# Altium footprint library ref-packages.PCBLIB: 1543 footprints (part 35 of 103) (continued)
## MQFP64-1 [mm]
pads (64):
  rect 2.2x0.35 smd: 1(-8.1,6) 2(-8.1,5.2) 3(-8.1,4.4) 4(-8.1,3.6) 5(-8.1,2.8) 6(-8.1,2) 7(-8.1,1.2) 8(-8.1,0.4) 9(-8.1,-0.4) 10(-8.1,-1.2) 11(-8.1,-2) 12(-8.1,-2.8) 13(-8.1,-3.6) 14(-8.1,-4.4) 15(-8.1,-5.2) 16(-8.1,-6) 33(8.1,-6) 34(8.1,-5.2) 35(8.1,-4.4) 36(8.1,-3.6) 37(8.1,-2.8) 38(8.1,-2) 39(8.1,-1.2) 40(8.1,-0.4) 41(8.1,0.4) 42(8.1,1.2) 43(8.1,2) 44(8.1,2.8) 45(8.1,3.6) 46(8.1,4.4) 47(8.1,5.2) 48(8.1,6)
  rect 0.35x2.2 smd: 17(-6,-8.1) 18(-5.2,-8.1) 19(-4.4,-8.1) 20(-3.6,-8.1) 21(-2.8,-8.1) 22(-2,-8.1) 23(-1.2,-8.1) 24(-0.4,-8.1) 25(0.4,-8.1) 26(1.2,-8.1) 27(2,-8.1) 28(2.8,-8.1) 29(3.6,-8.1) 30(4.4,-8.1) 31(5.2,-8.1) 32(6,-8.1) 49(6,8.1) 50(5.2,8.1) 51(4.4,8.1) 52(3.6,8.1) 53(2.8,8.1) 54(2,8.1) 55(1.2,8.1) 56(0.4,8.1) 57(-0.4,8.1) 58(-1.2,8.1) 59(-2,8.1) 60(-2.8,8.1) 61(-3.6,8.1) 62(-4.4,8.1) 63(-5.2,8.1) 64(-6,8.1)
Top Overlay:
  circle w0.152: c-5.75,5.75 r0.5
  lines w0.152: -6.873,-6.373 -6.873,6.373 -6.373,6.873 6.373,6.873 6.873,6.373 6.873,-6.373 6.373,-6.873 -6.373,-6.873 -6.873,-6.373
Mechanical 16:
  rectangle: 6.873,5.825 8.473,6.175
  rectangle: 6.873,5.025 8.473,5.375
  rectangle: 6.873,4.225 8.473,4.575
  rectangle: 6.873,3.425 8.473,3.775
  rectangle: 6.873,2.625 8.473,2.975
  rectangle: 6.873,1.825 8.473,2.175
  rectangle: 6.873,1.025 8.473,1.375
  rectangle: 6.873,0.225 8.473,0.575
  rectangle: 6.873,-0.575 8.473,-0.225
  rectangle: 6.873,-1.375 8.473,-1.025
  rectangle: 6.873,-2.175 8.473,-1.825
  rectangle: 6.873,-2.975 8.473,-2.625
  rectangle: 6.873,-3.775 8.473,-3.425
  rectangle: 6.873,-4.575 8.473,-4.225
  rectangle: 6.873,-5.375 8.473,-5.025
  rectangle: 6.873,-6.175 8.473,-5.825
  rectangle: 5.825,-8.473 6.175,-6.873
  rectangle: 5.025,-8.473 5.375,-6.873
  rectangle: 4.225,-8.473 4.575,-6.873
  rectangle: 3.425,-8.473 3.775,-6.873
  rectangle: 2.625,-8.473 2.975,-6.873
  rectangle: 1.825,-8.473 2.175,-6.873
  rectangle: 1.025,-8.473 1.375,-6.873
  rectangle: 0.225,-8.473 0.575,-6.873
  rectangle: -0.575,-8.473 -0.225,-6.873
  rectangle: -1.375,-8.473 -1.025,-6.873
  rectangle: -2.175,-8.473 -1.825,-6.873
  rectangle: -2.975,-8.473 -2.625,-6.873
  rectangle: -3.775,-8.473 -3.425,-6.873
  rectangle: -4.575,-8.473 -4.225,-6.873
  rectangle: -5.375,-8.473 -5.025,-6.873
  rectangle: -6.175,-8.473 -5.825,-6.873
  rectangle: -8.473,-6.175 -6.873,-5.825
  rectangle: -8.473,-5.375 -6.873,-5.025
  rectangle: -8.473,-4.575 -6.873,-4.225
  rectangle: -8.473,-3.775 -6.873,-3.425
  rectangle: -8.473,-2.975 -6.873,-2.625
  rectangle: -8.473,-2.175 -6.873,-1.825
  rectangle: -8.473,-1.375 -6.873,-1.025
  rectangle: -8.473,-0.575 -6.873,-0.225
  rectangle: -8.473,0.225 -6.873,0.575
  rectangle: -8.473,1.025 -6.873,1.375
  rectangle: -8.473,1.825 -6.873,2.175
  rectangle: -8.473,2.625 -6.873,2.975
  rectangle: -8.473,3.425 -6.873,3.775
  rectangle: -8.473,4.225 -6.873,4.575
  rectangle: -8.473,5.025 -6.873,5.375
  rectangle: -8.473,5.825 -6.873,6.175
  rectangle: -5.375,6.873 -5.025,8.473
  rectangle: -6.175,6.873 -5.825,8.473
  rectangle: -3.775,6.873 -3.425,8.473
  rectangle: -4.575,6.873 -4.225,8.473
  rectangle: -2.975,6.873 -2.625,8.473
  rectangle: -2.175,6.848 -1.825,8.473
  rectangle: -1.375,6.873 -1.025,8.473
  rectangle: -0.575,6.873 -0.225,8.473
  rectangle: 0.225,6.873 0.575,8.473
  rectangle: 1.025,6.873 1.375,8.473
  rectangle: 1.825,6.873 2.175,8.473
  rectangle: 2.625,6.873 2.975,8.473
  rectangle: 3.425,6.873 3.775,8.473
  rectangle: 4.225,6.873 4.575,8.473
  rectangle: 5.825,6.873 6.175,8.473
  rectangle: 5.025,6.873 5.375,8.473

## MQFP80-1 [mm]
pads (80):
  rect 2.2x0.35 smd: 1(-8.125,6.175) 2(-8.125,5.525) 3(-8.125,4.875) 4(-8.125,4.225) 5(-8.125,3.575) 6(-8.125,2.925) 7(-8.125,2.275) 8(-8.125,1.625) 9(-8.125,0.975) 10(-8.125,0.325) 11(-8.125,-0.325) 12(-8.125,-0.975) 13(-8.125,-1.625) 14(-8.125,-2.275) 15(-8.125,-2.925) 16(-8.125,-3.575) 17(-8.125,-4.225) 18(-8.125,-4.875) 19(-8.125,-5.525) 20(-8.125,-6.175) 41(8.1,-6.175) 42(8.1,-5.525) 43(8.1,-4.875) 44(8.1,-4.225) 45(8.1,-3.575) 46(8.1,-2.925) 47(8.1,-2.275) 48(8.1,-1.625) 49(8.1,-0.975) 50(8.1,-0.325) 51(8.1,0.325) 52(8.1,0.975) 53(8.1,1.625) 54(8.1,2.275) 55(8.1,2.925) 56(8.1,3.575) 57(8.1,4.225) 58(8.1,4.875) 59(8.1,5.525) 60(8.1,6.175)
  rect 0.35x2.2 smd: 21(-6.175,-8.1) 22(-5.525,-8.1) 23(-4.875,-8.1) 24(-4.225,-8.1) 25(-3.575,-8.1) 26(-2.925,-8.1) 27(-2.275,-8.1) 28(-1.625,-8.1) 29(-0.975,-8.1) 30(-0.325,-8.1) 31(0.325,-8.1) 32(0.975,-8.1) 33(1.625,-8.1) 34(2.275,-8.1) 35(2.925,-8.1) 36(3.575,-8.1) 37(4.225,-8.1) 38(4.875,-8.1) 39(5.525,-8.1) 40(6.175,-8.1) 61(6.175,8.1) 62(5.525,8.1) 63(4.875,8.1) 64(4.225,8.1) 65(3.575,8.1) 66(2.925,8.1) 67(2.275,8.1) 68(1.625,8.1) 69(0.975,8.1) 70(0.325,8.1) 71(-0.325,8.1) 72(-0.975,8.1) 73(-1.625,8.1) 74(-2.275,8.1) 75(-2.925,8.1) 76(-3.575,8.1) 77(-4.225,8.1) 78(-4.875,8.1) 79(-5.525,8.1) 80(-6.175,8.1)
Top Overlay:
  circle w0.152: c-5,5 r1.118
  lines w0.152: -6.873,-6.373 -6.873,6.373 -6.373,6.873 6.373,6.873 6.873,6.373 6.873,-6.373 6.373,-6.873 -6.373,-6.873 -6.873,-6.373
Mechanical 16:
  rectangle: 6,6.873 6.35,8.473
  rectangle: 5.35,6.873 5.7,8.473
  rectangle: 4.7,6.873 5.05,8.473
  rectangle: 4.05,6.873 4.4,8.473
  rectangle: 3.4,6.873 3.75,8.473
  rectangle: 2.75,6.873 3.1,8.473
  rectangle: 2.1,6.873 2.45,8.473
  rectangle: 1.45,6.873 1.8,8.473
  rectangle: 0.8,6.873 1.15,8.473
  rectangle: 0.15,6.873 0.5,8.473
  rectangle: -0.5,6.873 -0.15,8.473
  rectangle: -1.15,6.873 -0.8,8.473
  rectangle: -1.8,6.873 -1.45,8.473
  rectangle: -2.45,6.873 -2.1,8.473
  rectangle: -3.1,6.873 -2.75,8.473
  rectangle: -3.75,6.873 -3.4,8.473
  rectangle: -4.4,6.873 -4.05,8.473
  rectangle: -5.05,6.873 -4.7,8.473
  rectangle: -5.7,6.873 -5.35,8.473
  rectangle: -6.35,6.873 -6,8.473
  rectangle: -8.473,6 -6.898,6.35
  rectangle: -8.473,5.35 -6.898,5.7
  rectangle: -8.473,4.05 -6.898,4.4
  rectangle: -8.473,4.7 -6.898,5.05
  rectangle: -8.473,3.4 -6.898,3.75
  rectangle: -8.473,2.75 -6.898,3.1
  rectangle: -8.473,2.1 -6.898,2.45
  rectangle: -8.473,1.45 -6.898,1.8
  rectangle: -8.473,0.8 -6.898,1.15
  rectangle: -8.473,0.15 -6.898,0.5
  rectangle: -8.473,-0.5 -6.898,-0.15
  rectangle: -8.473,-1.15 -6.898,-0.8
  rectangle: -8.473,-1.8 -6.898,-1.45
  rectangle: -8.473,-2.45 -6.898,-2.1
  rectangle: -8.473,-3.1 -6.898,-2.75
  rectangle: -8.473,-3.75 -6.898,-3.4
  rectangle: -8.473,-4.4 -6.898,-4.05
  rectangle: -8.473,-5.05 -6.898,-4.7
  rectangle: -8.473,-5.7 -6.898,-5.35
  rectangle: -8.473,-6.35 -6.898,-6
  rectangle: -6.35,-8.473 -6,-6.898
  rectangle: -5.7,-8.473 -5.35,-6.873
  rectangle: -5.05,-8.473 -4.7,-6.873
  rectangle: -4.4,-8.473 -4.05,-6.873
  rectangle: -3.75,-8.473 -3.4,-6.873
  rectangle: -3.1,-8.473 -2.75,-6.873
  rectangle: -2.45,-8.473 -2.1,-6.873
  rectangle: -1.8,-8.473 -1.45,-6.873
  rectangle: -1.15,-8.473 -0.8,-6.873
  rectangle: -0.5,-8.473 -0.15,-6.873
  rectangle: 0.15,-8.473 0.5,-6.873
  rectangle: 0.8,-8.473 1.15,-6.873
  rectangle: 1.45,-8.473 1.8,-6.873
  rectangle: 2.1,-8.473 2.45,-6.873
  rectangle: 2.75,-8.473 3.1,-6.873
  rectangle: 3.4,-8.473 3.75,-6.873
  rectangle: 4.05,-8.473 4.4,-6.873
  rectangle: 4.7,-8.473 5.05,-6.873
  rectangle: 5.35,-8.473 5.7,-6.873
  rectangle: 6,-8.473 6.35,-6.873
  rectangle: 6.873,6 8.473,6.35
  rectangle: 6.873,5.35 8.473,5.7
  rectangle: 6.873,4.7 8.473,5.05
  rectangle: 6.873,4.05 8.473,4.4
  rectangle: 6.873,3.4 8.473,3.75
  rectangle: 6.873,2.75 8.473,3.1
  rectangle: 6.873,2.1 8.473,2.45
  rectangle: 6.873,1.45 8.473,1.8
  rectangle: 6.873,0.8 8.473,1.15
  rectangle: 6.873,0.15 8.473,0.5
  rectangle: 6.873,-0.5 8.473,-0.15
  rectangle: 6.873,-1.15 8.473,-0.8
  rectangle: 6.873,-1.8 8.473,-1.45
  rectangle: 6.873,-2.45 8.473,-2.1
  rectangle: 6.873,-3.1 8.473,-2.75
  rectangle: 6.873,-3.75 8.473,-3.4
  rectangle: 6.873,-4.4 8.473,-4.05
  rectangle: 6.873,-5.05 8.473,-4.7
  rectangle: 6.873,-5.7 8.473,-5.35
  rectangle: 6.873,-6.35 8.473,-6

## MQFP80-2 [mm]
pads (80):
  rect 0.4x2.2 smd: 1(-9.2,-8.1) 2(-8.4,-8.1) 3(-7.6,-8.1) 4(-6.8,-8.1) 5(-6,-8.1) 6(-5.2,-8.1) 7(-4.4,-8.1) 8(-3.6,-8.1) 9(-2.8,-8.1) 10(-2,-8.1) 11(-1.2,-8.1) 12(-0.4,-8.1) 13(0.4,-8.1) 14(1.2,-8.1) 15(2,-8.1) 16(2.8,-8.1) 17(3.6,-8.1) 18(4.4,-8.1) 19(5.2,-8.1) 20(6,-8.1) 21(6.8,-8.1) 22(7.6,-8.1) 23(8.4,-8.1) 24(9.2,-8.1) 41(9.2,8.1) 42(8.4,8.1) 43(7.6,8.1) 44(6.8,8.1) 45(6,8.1) 46(5.2,8.1) 47(4.4,8.1) 48(3.6,8.1) 49(2.8,8.1) 50(2,8.1) 51(1.2,8.1) 52(0.4,8.1) 53(-0.4,8.1) 54(-1.2,8.1) 55(-2,8.1) 56(-2.8,8.1) 57(-3.6,8.1) 58(-4.4,8.1) 59(-5.2,8.1) 60(-6,8.1) 61(-6.8,8.1) 62(-7.6,8.1) 63(-8.4,8.1) 64(-9.2,8.1)
  rect 2.2x0.4 smd: 25(11.1,-6) 26(11.1,-5.2) 27(11.1,-4.4) 28(11.1,-3.6) 29(11.1,-2.8) 30(11.1,-2) 31(11.1,-1.2) 32(11.1,-0.4) 33(11.1,0.4) 34(11.1,1.2) 35(11.1,2) 36(11.1,2.8) 37(11.1,3.6) 38(11.1,4.4) 39(11.1,5.2) 40(11.1,6) 65(-11.1,6) 66(-11.1,5.2) 67(-11.1,4.4) 68(-11.1,3.6) 69(-11.1,2.8) 70(-11.1,2) 71(-11.1,1.2) 72(-11.1,0.4) 73(-11.1,-0.4) 74(-11.1,-1.2) 75(-11.1,-2) 76(-11.1,-2.8) 77(-11.1,-3.6) 78(-11.1,-4.4) 79(-11.1,-5.2) 80(-11.1,-6)
Top Overlay:
  circle w0.152: c-8,-5 r1
  lines w0.152: -9.873,-6.273 -9.873,6.273 -9.273,6.873 9.273,6.873 9.873,6.273 9.873,-6.273 9.273,-6.873 -9.273,-6.873 -9.873,-6.273
Mechanical 16:
  rectangle: -9.4,6.873 -9,8.473
  rectangle: -8.6,6.873 -8.2,8.473
  rectangle: -7.8,6.873 -7.4,8.473
  rectangle: -7,6.873 -6.6,8.473
  rectangle: -6.2,6.873 -5.8,8.473
  rectangle: -5.4,6.873 -5,8.473
  rectangle: -4.6,6.873 -4.2,8.473
  rectangle: -3.8,6.873 -3.4,8.473
  rectangle: -3,6.873 -2.6,8.473
  rectangle: -2.2,6.873 -1.8,8.473
  rectangle: -1.4,6.873 -1,8.473
  rectangle: -0.6,6.873 -0.2,8.473
  rectangle: 0.2,6.873 0.6,8.473
  rectangle: 1,6.873 1.4,8.473
  rectangle: 1.8,6.873 2.2,8.473
  rectangle: 2.6,6.873 3,8.473
  rectangle: 3.4,6.873 3.8,8.473
  rectangle: 4.2,6.873 4.6,8.473
  rectangle: 5,6.873 5.4,8.473
  rectangle: 5.8,6.873 6.2,8.473
  rectangle: 6.6,6.873 7,8.473
  rectangle: 7.4,6.873 7.8,8.473
  rectangle: 8.2,6.873 8.6,8.473
  rectangle: 9,6.873 9.4,8.473
  rectangle: -9.4,-8.473 -9,-6.873
  rectangle: -8.6,-8.473 -8.2,-6.873
  rectangle: -7.8,-8.473 -7.4,-6.873
  rectangle: -7,-8.473 -6.6,-6.873
  rectangle: -6.2,-8.473 -5.8,-6.873
  rectangle: -5.4,-8.473 -5,-6.873
  rectangle: -4.6,-8.473 -4.2,-6.873
  rectangle: -3.8,-8.473 -3.4,-6.873
  rectangle: -3,-8.473 -2.6,-6.873
  rectangle: -2.2,-8.473 -1.8,-6.873
  rectangle: -1.4,-8.473 -1,-6.873
  rectangle: -0.6,-8.473 -0.2,-6.873
  rectangle: 0.2,-8.473 0.6,-6.873
  rectangle: 1,-8.473 1.4,-6.873
  rectangle: 1.8,-8.473 2.2,-6.873
  rectangle: 2.6,-8.473 3,-6.873
  rectangle: 3.4,-8.473 3.8,-6.873
  rectangle: 4.2,-8.473 4.6,-6.873
  rectangle: 5,-8.473 5.4,-6.873
  rectangle: 5.8,-8.473 6.2,-6.873
  rectangle: 6.6,-8.473 7,-6.873
  rectangle: 7.4,-8.473 7.8,-6.873
  rectangle: 8.2,-8.473 8.6,-6.873
  rectangle: 9,-8.473 9.4,-6.873
  rectangle: -11.473,5.8 -9.873,6.2
  rectangle: -11.473,5 -9.873,5.4
  rectangle: -11.473,4.2 -9.873,4.6
  rectangle: -11.473,3.4 -9.873,3.8
  rectangle: -11.473,2.6 -9.873,3
  rectangle: -11.473,1.8 -9.873,2.2
  rectangle: -11.473,1 -9.873,1.4
  rectangle: -11.473,0.2 -9.873,0.6
  rectangle: -11.473,-0.6 -9.873,-0.2
  rectangle: -11.473,-1.4 -9.873,-1
  rectangle: -11.473,-2.2 -9.873,-1.8
  rectangle: -11.473,-3 -9.848,-2.6
  rectangle: -11.473,-3.8 -9.898,-3.4
  rectangle: -11.473,-4.6 -9.873,-4.2
  rectangle: -11.473,-5.4 -9.873,-5
  rectangle: 9.873,5.8 11.473,6.2
  rectangle: 9.873,5 11.473,5.4
  rectangle: 9.873,4.2 11.473,4.6
  rectangle: 9.873,3.4 11.473,3.8
  rectangle: 9.873,2.6 11.473,3
  rectangle: 9.873,1.8 11.473,2.2
  rectangle: 9.873,1 11.473,1.4
  rectangle: 9.848,0.2 11.473,0.6
  rectangle: 9.873,-0.6 11.473,-0.2
  rectangle: 9.873,-1.4 11.473,-1
  rectangle: 9.873,-2.2 11.473,-1.8
  rectangle: 9.873,-3 11.473,-2.6
  rectangle: 9.873,-3.8 11.473,-3.4
  rectangle: 9.873,-4.6 11.473,-4.2
  rectangle: 9.873,-5.4 11.473,-5
  rectangle: 9.873,-6.2 11.473,-5.8
  rectangle: -11.473,-6.2 -9.873,-5.8

## MQFP100 [mm]
pads (100):
  rect 0.35x2.2 smd: 1(-9.425,-8.1) 2(-8.775,-8.1) 3(-8.125,-8.1) 4(-7.475,-8.1) 5(-6.825,-8.1) 6(-6.175,-8.1) 7(-5.525,-8.1) 8(-4.875,-8.1) 9(-4.225,-8.1) 10(-3.575,-8.1) 11(-2.925,-8.1) 12(-2.275,-8.1) 13(-1.625,-8.1) 14(-0.975,-8.1) 15(-0.325,-8.1) 16(0.325,-8.1) 17(0.975,-8.1) 18(1.625,-8.1) 19(2.275,-8.1) 20(2.925,-8.1) 21(3.575,-8.1) 22(4.225,-8.1) 23(4.875,-8.1) 24(5.525,-8.1) 25(6.175,-8.1) 26(6.825,-8.1) 27(7.475,-8.1) 28(8.125,-8.1) 29(8.775,-8.1) 30(9.425,-8.1) 51(9.425,8.1) 52(8.775,8.1) 53(8.125,8.1) 54(7.475,8.1) 55(6.825,8.1) 56(6.175,8.1) 57(5.525,8.1) 58(4.875,8.1) 59(4.225,8.1) 60(3.575,8.1) 61(2.925,8.1) 62(2.275,8.1) 63(1.625,8.1) 64(0.975,8.1) 65(0.325,8.1) 66(-0.325,8.1) 67(-0.975,8.1) 68(-1.625,8.1) 69(-2.275,8.1) 70(-2.925,8.1) 71(-3.575,8.1) 72(-4.225,8.1) 73(-4.875,8.1) 74(-5.525,8.1) 75(-6.175,8.1) 76(-6.825,8.1) 77(-7.475,8.1) 78(-8.125,8.1) 79(-8.775,8.1) 80(-9.425,8.1)
  rect 2.2x0.35 smd: 31(11.1,-6.175) 32(11.1,-5.525) 33(11.1,-4.875) 34(11.1,-4.225) 35(11.1,-3.575) 36(11.1,-2.925) 37(11.1,-2.275) 38(11.1,-1.625) 39(11.1,-0.975) 40(11.1,-0.325) 41(11.1,0.325) 42(11.1,0.975) 43(11.1,1.625) 44(11.1,2.275) 45(11.1,2.925) 46(11.1,3.575) 47(11.1,4.225) 48(11.1,4.875) 49(11.1,5.525) 50(11.1,6.175) 81(-11.1,6.175) 82(-11.1,5.525) 83(-11.1,4.875) 84(-11.1,4.225) 85(-11.1,3.575) 86(-11.1,2.925) 87(-11.1,2.275) 88(-11.1,1.625) 89(-11.1,0.975) 90(-11.1,0.325) 91(-11.1,-0.325) 92(-11.1,-0.975) 93(-11.1,-1.625) 94(-11.1,-2.275) 95(-11.1,-2.925) 96(-11.1,-3.575) 97(-11.1,-4.225) 98(-11.1,-4.875) 99(-11.1,-5.525) 100(-11.1,-6.175)
Top Overlay:
  circle w0.152: c-8.9,-6 r0.608
  lines w0.152: -9.873,-6.473 -9.873,6.473 -9.473,6.873 9.473,6.873 9.873,6.473 9.873,-6.473 9.473,-6.873 -9.473,-6.873 -9.873,-6.473
Mechanical 16:
  rectangle: -9.6,-8.473 -9.25,-6.873
  rectangle: -8.95,-8.473 -8.6,-6.873
  rectangle: -8.3,-8.473 -7.95,-6.873
  rectangle: -7.65,-8.473 -7.3,-6.873
  rectangle: -7,-8.473 -6.65,-6.873
  rectangle: -6.35,-8.473 -6,-6.873
  rectangle: -5.7,-8.473 -5.35,-6.873
  rectangle: -5.05,-8.473 -4.7,-6.873
  rectangle: -4.4,-8.473 -4.05,-6.873
  rectangle: -3.75,-8.473 -3.4,-6.873
  rectangle: -3.1,-8.473 -2.75,-6.873
  rectangle: -2.45,-8.473 -2.1,-6.873
  rectangle: -1.8,-8.473 -1.45,-6.873
  rectangle: -1.15,-8.473 -0.8,-6.873
  rectangle: -0.5,-8.473 -0.15,-6.873
  rectangle: 0.15,-8.473 0.5,-6.873
  rectangle: 0.8,-8.473 1.15,-6.873
  rectangle: 1.45,-8.473 1.8,-6.873
  rectangle: 2.1,-8.473 2.45,-6.873
  rectangle: 2.75,-8.473 3.1,-6.873
  rectangle: 3.4,-8.473 3.75,-6.873
  rectangle: 4.05,-8.473 4.4,-6.873
  rectangle: 4.7,-8.473 5.05,-6.873
  rectangle: 5.35,-8.473 5.7,-6.873
  rectangle: 6,-8.473 6.35,-6.873
  rectangle: 6.65,-8.473 7,-6.873
  rectangle: 7.3,-8.473 7.65,-6.873
  rectangle: 7.95,-8.473 8.3,-6.873
  rectangle: 8.6,-8.473 8.95,-6.873
  rectangle: 9.25,-8.473 9.6,-6.873
  rectangle: -9.6,6.873 -9.25,8.473
  rectangle: -8.95,6.873 -8.6,8.473
  rectangle: -8.3,6.873 -7.95,8.473
  rectangle: -7.65,6.873 -7.3,8.473
  rectangle: -7,6.873 -6.65,8.473
  rectangle: -6.35,6.873 -6,8.473
  rectangle: -5.7,6.873 -5.35,8.473
  rectangle: -5.05,6.873 -4.7,8.473
  rectangle: -4.4,6.873 -4.05,8.473
  rectangle: -3.75,6.873 -3.4,8.473
  rectangle: -3.1,6.873 -2.75,8.473
  rectangle: -2.45,6.873 -2.1,8.473
  rectangle: -1.8,6.873 -1.45,8.473
  rectangle: -1.15,6.873 -0.8,8.473
  rectangle: -0.5,6.873 -0.15,8.473
  rectangle: 0.15,6.873 0.5,8.473
  rectangle: 0.8,6.873 1.15,8.473
  rectangle: 1.45,6.873 1.8,8.473
  rectangle: 2.1,6.873 2.45,8.473
  rectangle: 2.75,6.873 3.1,8.473
  rectangle: 3.4,6.873 3.75,8.473
  rectangle: 4.05,6.873 4.4,8.473
  rectangle: 4.7,6.873 5.05,8.473
  rectangle: 5.35,6.873 5.7,8.473
  rectangle: 6,6.873 6.35,8.473
  rectangle: 6.65,6.873 7,8.473
  rectangle: 7.275,6.873 7.65,8.473
  rectangle: 7.95,6.873 8.3,8.473
  rectangle: 8.6,6.873 8.95,8.473
  rectangle: 9.25,6.873 9.6,8.473
  rectangle: 9.873,6 11.473,6.35
  rectangle: 9.873,5.35 11.473,5.7
  rectangle: 9.873,4.7 11.473,5.05
  rectangle: 9.873,4.05 11.473,4.4
  rectangle: 9.873,3.4 11.473,3.75
  rectangle: 9.873,2.75 11.473,3.1
  rectangle: 9.873,2.1 11.473,2.45
  rectangle: 9.873,1.45 11.473,1.8
  rectangle: 9.873,0.8 11.473,1.15
  rectangle: 9.873,0.15 11.473,0.5
  rectangle: 9.873,-0.5 11.473,-0.15
  rectangle: 9.873,-1.15 11.473,-0.8
  rectangle: 9.873,-1.8 11.473,-1.45
  rectangle: 9.873,-2.45 11.473,-2.1
  rectangle: 9.873,-3.1 11.473,-2.75
  rectangle: 9.873,-3.75 11.473,-3.4
  rectangle: 9.873,-4.4 11.473,-4.05
  rectangle: 9.873,-5.05 11.473,-4.7
  rectangle: 9.873,-5.7 11.473,-5.35
  rectangle: 9.873,-6.35 11.473,-6
  rectangle: -11.473,6 -9.873,6.35
  rectangle: -11.473,5.35 -9.873,5.7
  rectangle: -11.473,4.7 -9.873,5.05
  rectangle: -11.473,4.05 -9.873,4.4
  rectangle: -11.473,3.4 -9.873,3.75
  rectangle: -11.473,2.75 -9.873,3.1
  rectangle: -11.473,2.1 -9.873,2.45
  rectangle: -11.473,1.45 -9.873,1.8
  rectangle: -11.473,0.8 -9.873,1.15
  rectangle: -11.473,0.15 -9.873,0.5
  rectangle: -11.473,-0.5 -9.848,-0.15
  rectangle: -11.473,-1.15 -9.873,-0.8
  rectangle: -11.473,-1.8 -9.873,-1.45
  rectangle: -11.473,-2.45 -9.873,-2.1
  rectangle: -11.473,-3.1 -9.873,-2.75
  rectangle: -11.473,-3.75 -9.873,-3.4
  rectangle: -11.473,-4.4 -9.873,-4.05
  rectangle: -11.473,-5.05 -9.873,-4.7
  rectangle: -11.473,-5.7 -9.873,-5.35
  rectangle: -11.473,-6.35 -9.873,-6

## MQFP132 [mm]
pads (132):
  rect 0.35x2.2 smd: 1(0,12.7) 2(-0.635,12.7) 3(-1.27,12.7) 4(-1.905,12.7) 5(-2.54,12.7) 6(-3.175,12.7) 7(-3.81,12.7) 8(-4.445,12.7) 9(-5.08,12.7) 10(-5.715,12.7) 11(-6.35,12.7) 12(-6.985,12.7) 13(-7.62,12.7) 14(-8.255,12.7) 15(-8.89,12.7) 16(-9.525,12.7) 17(-10.16,12.7) 51(-10.16,-13.97) 52(-9.525,-13.97) 53(-8.89,-13.97) 54(-8.255,-13.97) 55(-7.62,-13.97) 56(-6.985,-13.97) 57(-6.35,-13.97) 58(-5.715,-13.97) 59(-5.08,-13.97) 60(-4.445,-13.97) 61(-3.81,-13.97) 62(-3.175,-13.97) 63(-2.54,-13.97) 64(-1.905,-13.97) 65(-1.27,-13.97) 66(-0.635,-13.97) 67(0,-13.97) 68(0.635,-13.97) 69(1.27,-13.97) 70(1.905,-13.97) 71(2.54,-13.97) 72(3.175,-13.97) 73(3.81,-13.97) 74(4.445,-13.97) 75(5.08,-13.97) 76(5.715,-13.97) 77(6.35,-13.97) 78(6.985,-13.97) 79(7.62,-13.97) 80(8.255,-13.97) 81(8.89,-13.97) 82(9.525,-13.97) 83(10.16,-13.97) 117(10.16,12.7) 118(9.525,12.7) 119(8.89,12.7) 120(8.255,12.7) 121(7.62,12.7) 122(6.985,12.7) 123(6.35,12.7) 124(5.715,12.7) 125(5.08,12.7) 126(4.445,12.7) 127(3.81,12.7) 128(3.175,12.7) 129(2.54,12.7) 130(1.905,12.7) 131(1.27,12.7) 132(0.635,12.7)
  rect 2.2x0.35 smd: 18(-13.335,9.525) 19(-13.335,8.89) 20(-13.335,8.255) 21(-13.335,7.62) 22(-13.335,6.985) 23(-13.335,6.35) 24(-13.335,5.715) 25(-13.335,5.08) 26(-13.335,4.445) 27(-13.335,3.81) 28(-13.335,3.175) 29(-13.335,2.54) 30(-13.335,1.905) 31(-13.335,1.27) 32(-13.335,0.635) 33(-13.335,0) 34(-13.335,-0.635) 35(-13.335,-1.27) 36(-13.335,-1.905) 37(-13.335,-2.54) 38(-13.335,-3.175) 39(-13.335,-3.81) 40(-13.335,-4.445) 41(-13.335,-5.08) 42(-13.335,-5.715) 43(-13.335,-6.35) 44(-13.335,-6.985) 45(-13.335,-7.62) 46(-13.335,-8.255) 47(-13.335,-8.89) 48(-13.335,-9.525) 49(-13.335,-10.16) 50(-13.335,-10.795) 84(13.335,-10.795) 85(13.335,-10.16) 86(13.335,-9.525) 87(13.335,-8.89) 88(13.335,-8.255) 89(13.335,-7.62) 90(13.335,-6.985) 91(13.335,-6.35) 92(13.335,-5.715) 93(13.335,-5.08) 94(13.335,-4.445) 95(13.335,-3.81) 96(13.335,-3.175) 97(13.335,-2.54) 98(13.335,-1.905) 99(13.335,-1.27) 100(13.335,-0.635) 101(13.335,0) 102(13.335,0.635) 103(13.335,1.27) 104(13.335,1.905) 105(13.335,2.54) 106(13.335,3.175) 107(13.335,3.81) 108(13.335,4.445) 109(13.335,5.08) 110(13.335,5.715) 111(13.335,6.35) 112(13.335,6.985) 113(13.335,7.62) 114(13.335,8.255) 115(13.335,8.89) 116(13.335,9.525)
Top Overlay:
  lines w0.051: -12.233,-11.868 -11.733,-11.868 ; -12.233,10.583 -11.733,10.583 ; -11.233,-12.868 -11.233,-12.368 ; -11.233,11.583 -11.233,11.083 ; 11.217,11.583 11.217,11.083 ; 11.218,-12.868 11.218,-12.368 ; 12.218,-11.868 11.718,-11.868 ; 12.217,10.583 11.717,10.583 ; -11.733,-11.868 -11.733,10.583 ; -11.733,-11.868 -11.233,-12.368 ; -11.733,10.583 -11.233,11.083 ; -11.233,-12.368 11.218,-12.368 ; -11.233,11.083 11.217,11.083 ; 11.217,11.083 11.717,10.583 ; 11.218,-12.368 11.718,-11.868 ; 11.717,10.583 11.718,-11.868
  lines w0.152: -12.233,-11.868 -11.233,-12.868 ; -12.233,10.583 -11.233,11.583 ; 11.217,11.583 12.217,10.583 ; 11.218,-12.868 12.218,-11.868
  lines w0.508: 0,8.414 0,10.319 ; 0,10.319 0.635,9.684 -0.635,9.684 0,10.319
Mechanical 16:
  rectangle: 1.111,11.589 1.429,12.7
  rectangle: 1.746,11.589 2.064,12.7
  rectangle: 2.381,11.589 2.699,12.7
  rectangle: 3.016,11.589 3.334,12.7
  rectangle: 3.651,11.589 3.969,12.7
  rectangle: 4.286,11.589 4.604,12.7
  rectangle: 0.476,11.589 0.794,12.7
  rectangle: -0.159,11.589 0.159,12.7
  rectangle: -0.794,11.589 -0.476,12.7
  rectangle: -1.429,11.589 -1.111,12.7
  rectangle: -2.064,11.589 -1.746,12.7
  rectangle: -2.699,11.589 -2.381,12.7
  rectangle: -3.334,11.589 -3.016,12.7
  rectangle: -3.969,11.589 -3.651,12.7
  rectangle: -4.604,11.589 -4.286,12.7
  rectangle: -5.239,11.589 -4.921,12.7
  rectangle: -5.874,11.589 -5.556,12.7
  rectangle: -6.509,11.589 -6.191,12.7
  rectangle: -7.144,11.589 -6.826,12.7
  rectangle: -7.779,11.589 -7.461,12.7
  rectangle: -8.414,11.589 -8.096,12.7
  rectangle: -9.049,11.589 -8.731,12.7
  rectangle: -9.684,11.589 -9.366,12.7
  rectangle: -10.319,11.589 -10.001,12.7
  rectangle: 4.921,11.589 5.239,12.7
  rectangle: 5.556,11.589 5.874,12.7
  rectangle: 6.191,11.589 6.509,12.7
  rectangle: 6.826,11.589 7.144,12.7
  rectangle: 7.461,11.589 7.779,12.7
  rectangle: 8.096,11.589 8.414,12.7
  rectangle: 8.731,11.589 9.049,12.7
  rectangle: 9.366,11.589 9.684,12.7
  rectangle: 10.001,11.589 10.319,12.7
  rectangle: 12.224,9.366 13.335,9.684
  rectangle: 12.224,8.731 13.335,9.049
  rectangle: 12.224,8.096 13.335,8.414
  rectangle: 12.224,7.461 13.335,7.779
  rectangle: 12.224,6.826 13.335,7.144
  rectangle: 12.224,6.191 13.335,6.509
  rectangle: 12.224,5.556 13.335,5.874
  rectangle: 12.224,4.921 13.335,5.239
  rectangle: 12.224,4.286 13.335,4.604
  rectangle: 12.224,3.651 13.335,3.969
  rectangle: 12.224,3.016 13.335,3.334
  rectangle: 12.224,2.381 13.335,2.699
  rectangle: 12.224,1.746 13.335,2.064
  rectangle: 12.224,1.111 13.335,1.429
  rectangle: 12.224,0.476 13.335,0.794
  rectangle: 12.224,-0.159 13.335,0.159
  rectangle: 12.224,-0.794 13.335,-0.476
  rectangle: 12.224,-1.429 13.335,-1.111
  rectangle: 12.224,-2.064 13.335,-1.746
  rectangle: 12.224,-2.699 13.335,-2.381
  rectangle: 12.224,-3.334 13.335,-3.016
  rectangle: 12.224,-3.969 13.335,-3.651
  rectangle: 12.224,-4.604 13.335,-4.286
  rectangle: 12.224,-5.239 13.335,-4.921
  rectangle: 12.224,-5.874 13.335,-5.556
  rectangle: 12.224,-6.509 13.335,-6.191
  rectangle: 12.224,-7.144 13.335,-6.826
  rectangle: 12.224,-7.779 13.335,-7.461
  rectangle: 12.224,-8.414 13.335,-8.096
  rectangle: 12.224,-9.049 13.335,-8.731
  rectangle: 12.224,-9.684 13.335,-9.366
  rectangle: 12.224,-10.319 13.335,-10.001
  rectangle: 12.224,-10.954 13.335,-10.636
  rectangle: 10.001,-13.97 10.319,-12.859
  rectangle: 9.366,-13.97 9.684,-12.859
  rectangle: 8.731,-13.97 9.049,-12.859
  rectangle: 8.096,-13.97 8.414,-12.859
  rectangle: 7.461,-13.97 7.779,-12.859
  rectangle: 6.826,-13.97 7.144,-12.859
  rectangle: 6.191,-13.97 6.509,-12.859
  rectangle: 5.556,-13.97 5.874,-12.859
  rectangle: 4.921,-13.97 5.239,-12.859
  rectangle: 4.286,-13.97 4.604,-12.859
  rectangle: 3.651,-13.97 3.969,-12.859
  rectangle: 3.016,-13.97 3.334,-12.859
  rectangle: 2.381,-13.97 2.699,-12.859
  rectangle: 1.746,-13.97 2.064,-12.859
  rectangle: 1.111,-13.97 1.429,-12.859
  rectangle: 0.476,-13.97 0.794,-12.859
  rectangle: -0.159,-13.97 0.159,-12.859
  rectangle: -0.794,-13.97 -0.476,-12.859
  rectangle: -1.429,-13.97 -1.111,-12.859
  rectangle: -2.064,-13.97 -1.746,-12.859
  rectangle: -2.699,-13.97 -2.381,-12.859
  rectangle: -3.334,-13.97 -3.016,-12.859
  rectangle: -3.969,-13.97 -3.651,-12.859
  rectangle: -4.604,-13.97 -4.286,-12.859
  rectangle: -5.239,-13.97 -4.921,-12.859
  rectangle: -5.874,-13.97 -5.556,-12.859
  rectangle: -6.509,-13.97 -6.191,-12.859
  rectangle: -7.144,-13.97 -6.826,-12.859
  rectangle: -7.779,-13.97 -7.461,-12.859
  rectangle: -8.414,-13.97 -8.096,-12.859
  rectangle: -9.049,-13.97 -8.731,-12.859
  rectangle: -9.684,-13.97 -9.366,-12.859
  rectangle: -10.319,-13.97 -10.001,-12.859
  rectangle: -13.335,-10.954 -12.224,-10.636
  rectangle: -13.335,-10.319 -12.224,-10.001
  rectangle: -13.335,-9.684 -12.224,-9.366
  rectangle: -13.335,-9.049 -12.224,-8.731
  rectangle: -13.335,-8.414 -12.224,-8.096
  rectangle: -13.335,-7.779 -12.224,-7.461
  rectangle: -13.335,-7.144 -12.224,-6.826
  rectangle: -13.335,-6.509 -12.224,-6.191
  rectangle: -13.335,-5.874 -12.224,-5.556
  rectangle: -13.335,-5.239 -12.224,-4.921
  rectangle: -13.335,-4.604 -12.224,-4.286
  rectangle: -13.335,-3.969 -12.224,-3.651
  rectangle: -13.335,-3.334 -12.224,-3.016
  rectangle: -13.335,-2.699 -12.224,-2.381
  rectangle: -13.335,-2.064 -12.224,-1.746
  rectangle: -13.335,-1.429 -12.224,-1.111
  rectangle: -13.335,-0.794 -12.224,-0.476
  rectangle: -13.335,-0.159 -12.224,0.159
  rectangle: -13.335,0.476 -12.224,0.794
  rectangle: -13.335,1.111 -12.224,1.429
  rectangle: -13.335,1.746 -12.224,2.064
  rectangle: -13.335,2.381 -12.224,2.699
  rectangle: -13.335,3.016 -12.224,3.334
  rectangle: -13.335,3.651 -12.224,3.969
  rectangle: -13.335,4.286 -12.224,4.604
  rectangle: -13.335,4.921 -12.224,5.239
  rectangle: -13.335,5.556 -12.224,5.874
  rectangle: -13.335,6.191 -12.224,6.509
  rectangle: -13.335,6.826 -12.224,7.144
  rectangle: -13.335,7.461 -12.224,7.779
  rectangle: -13.335,8.096 -12.224,8.414
  rectangle: -13.335,9.366 -12.224,9.684
  lines w0.152: -12.233,-11.868 -12.233,10.583 ; -11.233,-12.868 11.218,-12.868 ; -11.233,11.583 11.217,11.583 ; 12.218,-11.868 12.217,10.583